# Altium footprint library con-samtec.PCBLIB: 805 footprints (part 50 of 55) (continued)
## TSW-144-02-S-T-RA [mil]
pads (132):
  oct 59.06x59.06 hole 39.37: 1(2150,60) 2(2150,160) 3(2150,260) 4(2050,60) 5(2050,160) 6(2050,260) 7(1950,60) 8(1950,160) 9(1950,260) 10(1850,60) 11(1850,160) 12(1850,260) 13(1750,60) 14(1750,160) 15(1750,260) 16(1650,60) 17(1650,160) 18(1650,260) 19(1550,60) 20(1550,160) 21(1550,260) 22(1450,60) 23(1450,160) 24(1450,260) 25(1350,60) 26(1350,160) 27(1350,260) 28(1250,60) 29(1250,160) 30(1250,260) 31(1150,60) 32(1150,160) 33(1150,260) 34(1050,60) 35(1050,160) 36(1050,260) 37(950,60) 38(950,160) 39(950,260) 40(850,60) 41(850,160) 42(850,260) 43(750,60) 44(750,160) 45(750,260) 46(650,60) 47(650,160) 48(650,260) 49(550,60) 50(550,160) 51(550,260) 52(450,60) 53(450,160) 54(450,260) 55(350,60) 56(350,160) 57(350,260) 58(250,60) 59(250,160) 60(250,260) 61(150,60) 62(150,160) 63(150,260) 64(50,60) 65(50,160) 66(50,260) 67(-50,60) 68(-50,160) 69(-50,260) 70(-150,60) 71(-150,160) 72(-150,260) 73(-250,60) 74(-250,160) 75(-250,260) 76(-350,60) 77(-350,160) 78(-350,260) 79(-450,60) 80(-450,160) 81(-450,260) 82(-550,60) 83(-550,160) 84(-550,260) 85(-650,60) 86(-650,160) 87(-650,260) 88(-750,60) 89(-750,160) 90(-750,260) 91(-850,60) 92(-850,160) 93(-850,260) 94(-950,60) 95(-950,160) 96(-950,260) 97(-1050,60) 98(-1050,160) 99(-1050,260) 100(-1150,60) 101(-1150,160) 102(-1150,260) 103(-1250,60) 104(-1250,160) 105(-1250,260) 106(-1350,60) 107(-1350,160) 108(-1350,260) 109(-1450,60) 110(-1450,160) 111(-1450,260) 112(-1550,60) 113(-1550,160) 114(-1550,260) 115(-1650,60) 116(-1650,160) 117(-1650,260) 118(-1750,60) 119(-1750,160) 120(-1750,260) 121(-1850,60) 122(-1850,160) 123(-1850,260) 124(-1950,60) 125(-1950,160) 126(-1950,260) 127(-2050,60) 128(-2050,160) 129(-2050,260) 130(-2150,60) 131(-2150,160) 132(-2150,260)
Top Overlay:
  rectangle: -2160,-310.63 -2140,-80.32
  rectangle: -2060,-310.63 -2040,-80.32
  rectangle: -1960,-310.63 -1940,-80.32
  rectangle: -1860,-310.63 -1840,-80.32
  rectangle: -1760,-310.63 -1740,-80.32
  rectangle: -1660,-310.63 -1640,-80.32
  rectangle: -1560,-310.63 -1540,-80.32
  rectangle: -1460,-310.63 -1440,-80.32
  rectangle: -1360,-310.63 -1340,-80.32
  rectangle: -1260,-310.63 -1240,-80.32
  rectangle: -1160,-310.63 -1140,-80.32
  rectangle: -1060,-310.63 -1040,-80.32
  rectangle: -960,-310.63 -940,-80.32
  rectangle: -860,-310.63 -840,-80.32
  rectangle: -760,-310.63 -740,-80.32
  rectangle: -660,-310.63 -640,-80.32
  rectangle: -560,-310.63 -540,-80.32
  rectangle: -460,-310.63 -440,-80.32
  rectangle: -360,-310.63 -340,-80.32
  rectangle: -260,-310.63 -240,-80.32
  rectangle: -160,-310.63 -140,-80.32
  rectangle: -60,-310.63 -40,-80.32
  rectangle: 40,-310.63 60,-80.32
  rectangle: 140,-310.63 160,-80.32
  rectangle: 240,-310.63 260,-80.32
  rectangle: 340,-310.63 360,-80.32
  rectangle: 440,-310.63 460,-80.32
  rectangle: 540,-310.63 560,-80.32
  rectangle: 640,-310.63 660,-80.32
  rectangle: 740,-310.63 760,-80.32
  rectangle: 840,-310.63 860,-80.32
  rectangle: 940,-310.63 960,-80.32
  rectangle: 1040,-310.63 1060,-80.32
  rectangle: 1140,-310.63 1160,-80.32
  rectangle: 1240,-310.63 1260,-80.32
  rectangle: 1340,-310.63 1360,-80.32
  rectangle: 1440,-310.63 1460,-80.32
  rectangle: 1540,-310.63 1560,-80.32
  rectangle: 1640,-310.63 1660,-80.32
  rectangle: 1740,-310.63 1760,-80.32
  rectangle: 1840,-310.63 1860,-80.32
  rectangle: 1940,-310.63 1960,-80.32
  rectangle: 2040,-310.63 2060,-80.32
  rectangle: 2140,-310.63 2160,-80.32
  lines w8: -2205.08,-80.55 2205.08,-80.55 2205.08,-4.17 -2205.08,-4.17 -2205.08,-80.55
  text "1" at 2201.57,41.34 h36.81
  text "3" at 2202.17,236.81 h36.81
Mechanical 16:
  rectangle: -2160,0 -2140,270
  rectangle: -2060,0 -2040,270
  rectangle: -1960,0 -1940,270
  rectangle: -1860,0 -1840,270
  rectangle: -1760,0 -1740,270
  rectangle: -1660,0 -1640,270
  rectangle: -1560,0 -1540,270
  rectangle: -1460,0 -1440,270
  rectangle: -1360,0 -1340,270
  rectangle: -1260,0 -1240,270
  rectangle: -1160,0 -1140,270
  rectangle: -1060,0 -1040,270
  rectangle: -960,0 -940,270
  rectangle: -860,0 -840,270
  rectangle: -760,0 -740,270
  rectangle: -660,0 -640,270
  rectangle: -560,0 -540,270
  rectangle: -460,0 -440,270
  rectangle: -360,0 -340,270
  rectangle: -260,0 -240,270
  rectangle: -160,0 -140,270
  rectangle: -60,0 -40,270
  rectangle: 40,0 60,270
  rectangle: 140,0 160,270
  rectangle: 240,0 260,270
  rectangle: 340,0 360,270
  rectangle: 440,0 460,270
  rectangle: 540,0 560,270
  rectangle: 640,0 660,270
  rectangle: 740,0 760,270
  rectangle: 840,0 860,270
  rectangle: 940,0 960,270
  rectangle: 1040,0 1060,270
  rectangle: 1140,0 1160,270
  rectangle: 1240,0 1260,270
  rectangle: 1340,0 1360,270
  rectangle: 1440,0 1460,270
  rectangle: 1540,0 1560,270
  rectangle: 1640,0 1660,270
  rectangle: 1740,0 1760,270
  rectangle: 1840,0 1860,270
  rectangle: 1940,0 1960,270
  rectangle: 2040,0 2060,270
  rectangle: 2140,0 2160,270

## TSW-145-02-S-D [mm]
pads (90):
  oct 1.5x1.5 hole 1: 1(55.88,-1.27) 2(55.88,1.27) 3(53.34,-1.27) 4(53.34,1.27) 5(50.8,-1.27) 6(50.8,1.27) 7(48.26,-1.27) 8(48.26,1.27) 9(45.72,-1.27) 10(45.72,1.27) 11(43.18,-1.27) 12(43.18,1.27) 13(40.64,-1.27) 14(40.64,1.27) 15(38.1,-1.27) 16(38.1,1.27) 17(35.56,-1.27) 18(35.56,1.27) 19(33.02,-1.27) 20(33.02,1.27) 21(30.48,-1.27) 22(30.48,1.27) 23(27.94,-1.27) 24(27.94,1.27) 25(25.4,-1.27) 26(25.4,1.27) 27(22.86,-1.27) 28(22.86,1.27) 29(20.32,-1.27) 30(20.32,1.27) 31(17.78,-1.27) 32(17.78,1.27) 33(15.24,-1.27) 34(15.24,1.27) 35(12.7,-1.27) 36(12.7,1.27) 37(10.16,-1.27) 38(10.16,1.27) 39(7.62,-1.27) 40(7.62,1.27) 41(5.08,-1.27) 42(5.08,1.27) 43(2.54,-1.27) 44(2.54,1.27) 45(0,-1.27) 46(0,1.27) 47(-2.54,-1.27) 48(-2.54,1.27) 49(-5.08,-1.27) 50(-5.08,1.27) 51(-7.62,-1.27) 52(-7.62,1.27) 53(-10.16,-1.27) 54(-10.16,1.27) 55(-12.7,-1.27) 56(-12.7,1.27) 57(-15.24,-1.27) 58(-15.24,1.27) 59(-17.78,-1.27) 60(-17.78,1.27) 61(-20.32,-1.27) 62(-20.32,1.27) 63(-22.86,-1.27) 64(-22.86,1.27) 65(-25.4,-1.27) 66(-25.4,1.27) 67(-27.94,-1.27) 68(-27.94,1.27) 69(-30.48,-1.27) 70(-30.48,1.27) 71(-33.02,-1.27) 72(-33.02,1.27) 73(-35.56,-1.27) 74(-35.56,1.27) 75(-38.1,-1.27) 76(-38.1,1.27) 77(-40.64,-1.27) 78(-40.64,1.27) 79(-43.18,-1.27) 80(-43.18,1.27) 81(-45.72,-1.27) 82(-45.72,1.27) 83(-48.26,-1.27) 84(-48.26,1.27) 85(-50.8,-1.27) 86(-50.8,1.27) 87(-53.34,-1.27) 88(-53.34,1.27) 89(-55.88,-1.27) 90(-55.88,1.27)
Top Overlay:
  lines w0.203: -57.279,-2.425 57.279,-2.425 57.279,2.425 -57.279,2.425 -57.279,-2.425
  text "1" at 55.672,-3.818 h0.94
  text "2" at 55.497,2.744 h0.94
Mechanical 16:
  rectangle: -56.23,-1.62 -55.53,-0.92
  rectangle: -56.23,0.92 -55.53,1.62
  rectangle: -53.69,-1.62 -52.99,-0.92
  rectangle: -53.69,0.92 -52.99,1.62
  rectangle: -51.15,-1.62 -50.45,-0.92
  rectangle: -51.15,0.92 -50.45,1.62
  rectangle: -48.61,-1.62 -47.91,-0.92
  rectangle: -48.61,0.92 -47.91,1.62
  rectangle: -46.07,-1.62 -45.37,-0.92
  rectangle: -46.07,0.92 -45.37,1.62
  rectangle: -43.53,-1.62 -42.83,-0.92
  rectangle: -43.53,0.92 -42.83,1.62
  rectangle: -40.99,-1.62 -40.29,-0.92
  rectangle: -40.99,0.92 -40.29,1.62
  rectangle: -38.45,-1.62 -37.75,-0.92
  rectangle: -38.45,0.92 -37.75,1.62
  rectangle: -35.91,-1.62 -35.21,-0.92
  rectangle: -35.91,0.92 -35.21,1.62
  rectangle: -33.37,-1.62 -32.67,-0.92
  rectangle: -33.37,0.92 -32.67,1.62
  rectangle: -30.83,-1.62 -30.13,-0.92
  rectangle: -30.83,0.92 -30.13,1.62
  rectangle: -28.29,-1.62 -27.59,-0.92
  rectangle: -28.29,0.92 -27.59,1.62
  rectangle: -25.75,-1.62 -25.05,-0.92
  rectangle: -25.75,0.92 -25.05,1.62
  rectangle: -23.21,-1.62 -22.51,-0.92
  rectangle: -23.21,0.92 -22.51,1.62
  rectangle: -20.67,-1.62 -19.97,-0.92
  rectangle: -20.67,0.92 -19.97,1.62
  rectangle: -18.13,-1.62 -17.43,-0.92
  rectangle: -18.13,0.92 -17.43,1.62
  rectangle: -15.59,-1.62 -14.89,-0.92
  rectangle: -15.59,0.92 -14.89,1.62
  rectangle: -13.05,-1.62 -12.35,-0.92
  rectangle: -13.05,0.92 -12.35,1.62
  rectangle: -10.51,-1.62 -9.81,-0.92
  rectangle: -10.51,0.92 -9.81,1.62
  rectangle: -7.97,-1.62 -7.27,-0.92
  rectangle: -7.97,0.92 -7.27,1.62
  rectangle: -5.43,-1.62 -4.73,-0.92
  rectangle: -5.43,0.92 -4.73,1.62
  rectangle: -2.89,-1.62 -2.19,-0.92
  rectangle: -2.89,0.92 -2.19,1.62
  rectangle: -0.35,-1.62 0.35,-0.92
  rectangle: -0.35,0.92 0.35,1.62
  rectangle: 2.19,-1.62 2.89,-0.92
  rectangle: 2.19,0.92 2.89,1.62
  rectangle: 4.73,-1.62 5.43,-0.92
  rectangle: 4.73,0.92 5.43,1.62
  rectangle: 7.27,-1.62 7.97,-0.92
  rectangle: 7.27,0.92 7.97,1.62
  rectangle: 9.81,-1.62 10.51,-0.92
  rectangle: 9.81,0.92 10.51,1.62
  rectangle: 12.35,-1.62 13.05,-0.92
  rectangle: 12.35,0.92 13.05,1.62
  rectangle: 14.89,-1.62 15.59,-0.92
  rectangle: 14.89,0.92 15.59,1.62
  rectangle: 17.43,-1.62 18.13,-0.92
  rectangle: 17.43,0.92 18.13,1.62
  rectangle: 19.97,-1.62 20.67,-0.92
  rectangle: 19.97,0.92 20.67,1.62
  rectangle: 22.51,-1.62 23.21,-0.92
  rectangle: 22.51,0.92 23.21,1.62
  rectangle: 25.05,-1.62 25.75,-0.92
  rectangle: 25.05,0.92 25.75,1.62
  rectangle: 27.59,-1.62 28.29,-0.92
  rectangle: 27.59,0.92 28.29,1.62
  rectangle: 30.13,-1.62 30.83,-0.92
  rectangle: 30.13,0.92 30.83,1.62
  rectangle: 32.67,-1.62 33.37,-0.92
  rectangle: 32.67,0.92 33.37,1.62
  rectangle: 35.21,-1.62 35.91,-0.92
  rectangle: 35.21,0.92 35.91,1.62
  rectangle: 37.75,-1.62 38.45,-0.92
  rectangle: 37.75,0.92 38.45,1.62
  rectangle: 40.29,-1.62 40.99,-0.92
  rectangle: 40.29,0.92 40.99,1.62
  rectangle: 42.83,-1.62 43.53,-0.92
  rectangle: 42.83,0.92 43.53,1.62
  rectangle: 45.37,-1.62 46.07,-0.92
  rectangle: 45.37,0.92 46.07,1.62
  rectangle: 47.91,-1.62 48.61,-0.92
  rectangle: 47.91,0.92 48.61,1.62
  rectangle: 50.45,-1.62 51.15,-0.92
  rectangle: 50.45,0.92 51.15,1.62
  rectangle: 52.99,-1.62 53.69,-0.92
  rectangle: 52.99,0.92 53.69,1.62
  rectangle: 55.53,-1.62 56.23,-0.92
  rectangle: 55.53,0.92 56.23,1.62

## TSW-145-02-S-D-RA [mil]
pads (90):
  oct 59.06x59.06 hole 39.37: 1(2200,60) 2(2200,160) 3(2100,60) 4(2100,160) 5(2000,60) 6(2000,160) 7(1900,60) 8(1900,160) 9(1800,60) 10(1800,160) 11(1700,60) 12(1700,160) 13(1600,60) 14(1600,160) 15(1500,60) 16(1500,160) 17(1400,60) 18(1400,160) 19(1300,60) 20(1300,160) 21(1200,60) 22(1200,160) 23(1100,60) 24(1100,160) 25(1000,60) 26(1000,160) 27(900,60) 28(900,160) 29(800,60) 30(800,160) 31(700,60) 32(700,160) 33(600,60) 34(600,160) 35(500,60) 36(500,160) 37(400,60) 38(400,160) 39(300,60) 40(300,160) 41(200,60) 42(200,160) 43(100,60) 44(100,160) 45(0,60) 46(0,160) 47(-100,60) 48(-100,160) 49(-200,60) 50(-200,160) 51(-300,60) 52(-300,160) 53(-400,60) 54(-400,160) 55(-500,60) 56(-500,160) 57(-600,60) 58(-600,160) 59(-700,60) 60(-700,160) 61(-800,60) 62(-800,160) 63(-900,60) 64(-900,160) 65(-1000,60) 66(-1000,160) 67(-1100,60) 68(-1100,160) 69(-1200,60) 70(-1200,160) 71(-1300,60) 72(-1300,160) 73(-1400,60) 74(-1400,160) 75(-1500,60) 76(-1500,160) 77(-1600,60) 78(-1600,160) 79(-1700,60) 80(-1700,160) 81(-1800,60) 82(-1800,160) 83(-1900,60) 84(-1900,160) 85(-2000,60) 86(-2000,160) 87(-2100,60) 88(-2100,160) 89(-2200,60) 90(-2200,160)
Top Overlay:
  rectangle: -2210,-310.63 -2190,-80.32
  rectangle: -2110,-310.63 -2090,-80.32
  rectangle: -2010,-310.63 -1990,-80.32
  rectangle: -1910,-310.63 -1890,-80.32
  rectangle: -1810,-310.63 -1790,-80.32
  rectangle: -1710,-310.63 -1690,-80.32
  rectangle: -1610,-310.63 -1590,-80.32
  rectangle: -1510,-310.63 -1490,-80.32
  rectangle: -1410,-310.63 -1390,-80.32
  rectangle: -1310,-310.63 -1290,-80.32
  rectangle: -1210,-310.63 -1190,-80.32
  rectangle: -1110,-310.63 -1090,-80.32
  rectangle: -1010,-310.63 -990,-80.32
  rectangle: -910,-310.63 -890,-80.32
  rectangle: -810,-310.63 -790,-80.32
  rectangle: -710,-310.63 -690,-80.32
  rectangle: -610,-310.63 -590,-80.32
  rectangle: -510,-310.63 -490,-80.32
  rectangle: -410,-310.63 -390,-80.32
  rectangle: -310,-310.63 -290,-80.32
  rectangle: -210,-310.63 -190,-80.32
  rectangle: -110,-310.63 -90,-80.32
  rectangle: -10,-310.63 10,-80.32
  rectangle: 90,-310.63 110,-80.32
  rectangle: 190,-310.63 210,-80.32
  rectangle: 290,-310.63 310,-80.32
  rectangle: 390,-310.63 410,-80.32
  rectangle: 490,-310.63 510,-80.32
  rectangle: 590,-310.63 610,-80.32
  rectangle: 690,-310.63 710,-80.32
  rectangle: 790,-310.63 810,-80.32
  rectangle: 890,-310.63 910,-80.32
  rectangle: 990,-310.63 1010,-80.32
  rectangle: 1090,-310.63 1110,-80.32
  rectangle: 1190,-310.63 1210,-80.32
  rectangle: 1290,-310.63 1310,-80.32
  rectangle: 1390,-310.63 1410,-80.32
  rectangle: 1490,-310.63 1510,-80.32
  rectangle: 1590,-310.63 1610,-80.32
  rectangle: 1690,-310.63 1710,-80.32
  rectangle: 1790,-310.63 1810,-80.32
  rectangle: 1890,-310.63 1910,-80.32
  rectangle: 1990,-310.63 2010,-80.32
  rectangle: 2090,-310.63 2110,-80.32
  rectangle: 2190,-310.63 2210,-80.32
  lines w8: -2255.08,-80.55 2255.08,-80.55 2255.08,-4.17 -2255.08,-4.17 -2255.08,-80.55
  text "1" at 2250.59,30.51 h36.81
  text "2" at 2249.21,129.53 h36.81
Mechanical 16:
  rectangle: -2210,0 -2190,170
  rectangle: -2110,0 -2090,170
  rectangle: -2010,0 -1990,170
  rectangle: -1910,0 -1890,170
  rectangle: -1810,0 -1790,170
  rectangle: -1710,0 -1690,170
  rectangle: -1610,0 -1590,170
  rectangle: -1510,0 -1490,170
  rectangle: -1410,0 -1390,170
  rectangle: -1310,0 -1290,170
  rectangle: -1210,0 -1190,170
  rectangle: -1110,0 -1090,170
  rectangle: -1010,0 -990,170
  rectangle: -910,0 -890,170
  rectangle: -810,0 -790,170
  rectangle: -710,0 -690,170
  rectangle: -610,0 -590,170
  rectangle: -510,0 -490,170
  rectangle: -410,0 -390,170
  rectangle: -310,0 -290,170
  rectangle: -210,0 -190,170
  rectangle: -110,0 -90,170
  rectangle: -10,0 10,170
  rectangle: 90,0 110,170
  rectangle: 190,0 210,170
  rectangle: 290,0 310,170
  rectangle: 390,0 410,170
  rectangle: 490,0 510,170
  rectangle: 590,0 610,170
  rectangle: 690,0 710,170
  rectangle: 790,0 810,170
  rectangle: 890,0 910,170
  rectangle: 990,0 1010,170
  rectangle: 1090,0 1110,170
  rectangle: 1190,0 1210,170
  rectangle: 1290,0 1310,170
  rectangle: 1390,0 1410,170
  rectangle: 1490,0 1510,170
  rectangle: 1590,0 1610,170
  rectangle: 1690,0 1710,170
  rectangle: 1790,0 1810,170
  rectangle: 1890,0 1910,170
  rectangle: 1990,0 2010,170
  rectangle: 2090,0 2110,170
  rectangle: 2190,0 2210,170

## TSW-145-02-S-Q [mm]
pads (90):
  oct 1.5x1.5 hole 1: 1(55.88,-2.54) 2(55.88,2.54) 3(53.34,-2.54) 4(53.34,2.54) 5(50.8,-2.54) 6(50.8,2.54) 7(48.26,-2.54) 8(48.26,2.54) 9(45.72,-2.54) 10(45.72,2.54) 11(43.18,-2.54) 12(43.18,2.54) 13(40.64,-2.54) 14(40.64,2.54) 15(38.1,-2.54) 16(38.1,2.54) 17(35.56,-2.54) 18(35.56,2.54) 19(33.02,-2.54) 20(33.02,2.54) 21(30.48,-2.54) 22(30.48,2.54) 23(27.94,-2.54) 24(27.94,2.54) 25(25.4,-2.54) 26(25.4,2.54) 27(22.86,-2.54) 28(22.86,2.54) 29(20.32,-2.54) 30(20.32,2.54) 31(17.78,-2.54) 32(17.78,2.54) 33(15.24,-2.54) 34(15.24,2.54) 35(12.7,-2.54) 36(12.7,2.54) 37(10.16,-2.54) 38(10.16,2.54) 39(7.62,-2.54) 40(7.62,2.54) 41(5.08,-2.54) 42(5.08,2.54) 43(2.54,-2.54) 44(2.54,2.54) 45(0,-2.54) 46(0,2.54) 47(-2.54,-2.54) 48(-2.54,2.54) 49(-5.08,-2.54) 50(-5.08,2.54) 51(-7.62,-2.54) 52(-7.62,2.54) 53(-10.16,-2.54) 54(-10.16,2.54) 55(-12.7,-2.54) 56(-12.7,2.54) 57(-15.24,-2.54) 58(-15.24,2.54) 59(-17.78,-2.54) 60(-17.78,2.54) 61(-20.32,-2.54) 62(-20.32,2.54) 63(-22.86,-2.54) 64(-22.86,2.54) 65(-25.4,-2.54) 66(-25.4,2.54) 67(-27.94,-2.54) 68(-27.94,2.54) 69(-30.48,-2.54) 70(-30.48,2.54) 71(-33.02,-2.54) 72(-33.02,2.54) 73(-35.56,-2.54) 74(-35.56,2.54) 75(-38.1,-2.54) 76(-38.1,2.54) 77(-40.64,-2.54) 78(-40.64,2.54) 79(-43.18,-2.54) 80(-43.18,2.54) 81(-45.72,-2.54) 82(-45.72,2.54) 83(-48.26,-2.54) 84(-48.26,2.54) 85(-50.8,-2.54) 86(-50.8,2.54) 87(-53.34,-2.54) 88(-53.34,2.54) 89(-55.88,-2.54) 90(-55.88,2.54)
Top Overlay:
  lines w0.203: -57.279,-3.695 57.279,-3.695 57.279,3.695 -57.279,3.695 -57.279,-3.695
  text "1" at 55.722,-5.138 h0.94
  text "2" at 55.622,3.989 h0.94
Mechanical 16:
  rectangle: -56.23,-2.89 -55.53,-2.19
  rectangle: -56.23,2.19 -55.53,2.89
  rectangle: -53.69,-2.89 -52.99,-2.19
  rectangle: -53.69,2.19 -52.99,2.89
  rectangle: -51.15,-2.89 -50.45,-2.19
  rectangle: -51.15,2.19 -50.45,2.89
  rectangle: -48.61,-2.89 -47.91,-2.19
  rectangle: -48.61,2.19 -47.91,2.89
  rectangle: -46.07,-2.89 -45.37,-2.19
  rectangle: -46.07,2.19 -45.37,2.89
  rectangle: -43.53,-2.89 -42.83,-2.19
  rectangle: -43.53,2.19 -42.83,2.89
  rectangle: -40.99,-2.89 -40.29,-2.19
  rectangle: -40.99,2.19 -40.29,2.89
  rectangle: -38.45,-2.89 -37.75,-2.19
  rectangle: -38.45,2.19 -37.75,2.89
  rectangle: -35.91,-2.89 -35.21,-2.19
  rectangle: -35.91,2.19 -35.21,2.89
  rectangle: -33.37,-2.89 -32.67,-2.19
  rectangle: -33.37,2.19 -32.67,2.89
  rectangle: -30.83,-2.89 -30.13,-2.19
  rectangle: -30.83,2.19 -30.13,2.89
  rectangle: -28.29,-2.89 -27.59,-2.19
  rectangle: -28.29,2.19 -27.59,2.89
  rectangle: -25.75,-2.89 -25.05,-2.19
  rectangle: -25.75,2.19 -25.05,2.89
  rectangle: -23.21,-2.89 -22.51,-2.19
  rectangle: -23.21,2.19 -22.51,2.89
  rectangle: -20.67,-2.89 -19.97,-2.19
  rectangle: -20.67,2.19 -19.97,2.89
  rectangle: -18.13,-2.89 -17.43,-2.19
  rectangle: -18.13,2.19 -17.43,2.89
  rectangle: -15.59,-2.89 -14.89,-2.19
  rectangle: -15.59,2.19 -14.89,2.89
  rectangle: -13.05,-2.89 -12.35,-2.19
  rectangle: -13.05,2.19 -12.35,2.89
  rectangle: -10.51,-2.89 -9.81,-2.19
  rectangle: -10.51,2.19 -9.81,2.89
  rectangle: -7.97,-2.89 -7.27,-2.19
  rectangle: -7.97,2.19 -7.27,2.89
  rectangle: -5.43,-2.89 -4.73,-2.19
  rectangle: -5.43,2.19 -4.73,2.89
  rectangle: -2.89,-2.89 -2.19,-2.19
  rectangle: -2.89,2.19 -2.19,2.89
  rectangle: -0.35,-2.89 0.35,-2.19
  rectangle: -0.35,2.19 0.35,2.89
  rectangle: 2.19,-2.89 2.89,-2.19
  rectangle: 2.19,2.19 2.89,2.89
  rectangle: 4.73,-2.89 5.43,-2.19
  rectangle: 4.73,2.19 5.43,2.89
  rectangle: 7.27,-2.89 7.97,-2.19
  rectangle: 7.27,2.19 7.97,2.89
  rectangle: 9.81,-2.89 10.51,-2.19
  rectangle: 9.81,2.19 10.51,2.89
  rectangle: 12.35,-2.89 13.05,-2.19
  rectangle: 12.35,2.19 13.05,2.89
  rectangle: 14.89,-2.89 15.59,-2.19
  rectangle: 14.89,2.19 15.59,2.89
  rectangle: 17.43,-2.89 18.13,-2.19
  rectangle: 17.43,2.19 18.13,2.89
  rectangle: 19.97,-2.89 20.67,-2.19
  rectangle: 19.97,2.19 20.67,2.89
  rectangle: 22.51,-2.89 23.21,-2.19
  rectangle: 22.51,2.19 23.21,2.89
  rectangle: 25.05,-2.89 25.75,-2.19
  rectangle: 25.05,2.19 25.75,2.89
  rectangle: 27.59,-2.89 28.29,-2.19
  rectangle: 27.59,2.19 28.29,2.89
  rectangle: 30.13,-2.89 30.83,-2.19
  rectangle: 30.13,2.19 30.83,2.89
  rectangle: 32.67,-2.89 33.37,-2.19
  rectangle: 32.67,2.19 33.37,2.89
  rectangle: 35.21,-2.89 35.91,-2.19
  rectangle: 35.21,2.19 35.91,2.89
  rectangle: 37.75,-2.89 38.45,-2.19
  rectangle: 37.75,2.19 38.45,2.89
  rectangle: 40.29,-2.89 40.99,-2.19
  rectangle: 40.29,2.19 40.99,2.89
  rectangle: 42.83,-2.89 43.53,-2.19
  rectangle: 42.83,2.19 43.53,2.89
  rectangle: 45.37,-2.89 46.07,-2.19
  rectangle: 45.37,2.19 46.07,2.89
  rectangle: 47.91,-2.89 48.61,-2.19
  rectangle: 47.91,2.19 48.61,2.89
  rectangle: 50.45,-2.89 51.15,-2.19
  rectangle: 50.45,2.19 51.15,2.89
  rectangle: 52.99,-2.89 53.69,-2.19
  rectangle: 52.99,2.19 53.69,2.89
  rectangle: 55.53,-2.89 56.23,-2.19
  rectangle: 55.53,2.19 56.23,2.89

## TSW-145-02-S-Q-RA [mil]
pads (90):
  oct 59.06x59.06 hole 39.37: 1(2200,60) 2(2200,260) 3(2100,60) 4(2100,260) 5(2000,60) 6(2000,260) 7(1900,60) 8(1900,260) 9(1800,60) 10(1800,260) 11(1700,60) 12(1700,260) 13(1600,60) 14(1600,260) 15(1500,60) 16(1500,260) 17(1400,60) 18(1400,260) 19(1300,60) 20(1300,260) 21(1200,60) 22(1200,260) 23(1100,60) 24(1100,260) 25(1000,60) 26(1000,260) 27(900,60) 28(900,260) 29(800,60) 30(800,260) 31(700,60) 32(700,260) 33(600,60) 34(600,260) 35(500,60) 36(500,260) 37(400,60) 38(400,260) 39(300,60) 40(300,260) 41(200,60) 42(200,260) 43(100,60) 44(100,260) 45(0,60) 46(0,260) 47(-100,60) 48(-100,260) 49(-200,60) 50(-200,260) 51(-300,60) 52(-300,260) 53(-400,60) 54(-400,260) 55(-500,60) 56(-500,260) 57(-600,60) 58(-600,260) 59(-700,60) 60(-700,260) 61(-800,60) 62(-800,260) 63(-900,60) 64(-900,260) 65(-1000,60) 66(-1000,260) 67(-1100,60) 68(-1100,260) 69(-1200,60) 70(-1200,260) 71(-1300,60) 72(-1300,260) 73(-1400,60) 74(-1400,260) 75(-1500,60) 76(-1500,260) 77(-1600,60) 78(-1600,260) 79(-1700,60) 80(-1700,260) 81(-1800,60) 82(-1800,260) 83(-1900,60) 84(-1900,260) 85(-2000,60) 86(-2000,260) 87(-2100,60) 88(-2100,260) 89(-2200,60) 90(-2200,260)
Top Overlay:
  rectangle: -2210,-310.63 -2190,-80.32
  rectangle: -2110,-310.63 -2090,-80.32
  rectangle: -2010,-310.63 -1990,-80.32
  rectangle: -1910,-310.63 -1890,-80.32
  rectangle: -1810,-310.63 -1790,-80.32
  rectangle: -1710,-310.63 -1690,-80.32
  rectangle: -1610,-310.63 -1590,-80.32
  rectangle: -1510,-310.63 -1490,-80.32
  rectangle: -1410,-310.63 -1390,-80.32
  rectangle: -1310,-310.63 -1290,-80.32
  rectangle: -1210,-310.63 -1190,-80.32
  rectangle: -1110,-310.63 -1090,-80.32
  rectangle: -1010,-310.63 -990,-80.32
  rectangle: -910,-310.63 -890,-80.32
  rectangle: -810,-310.63 -790,-80.32
  rectangle: -710,-310.63 -690,-80.32
  rectangle: -610,-310.63 -590,-80.32
  rectangle: -510,-310.63 -490,-80.32
  rectangle: -410,-310.63 -390,-80.32
  rectangle: -310,-310.63 -290,-80.32
  rectangle: -210,-310.63 -190,-80.32
  rectangle: -110,-310.63 -90,-80.32
  rectangle: -10,-310.63 10,-80.32
  rectangle: 90,-310.63 110,-80.32
  rectangle: 190,-310.63 210,-80.32
  rectangle: 290,-310.63 310,-80.32
  rectangle: 390,-310.63 410,-80.32
  rectangle: 490,-310.63 510,-80.32
  rectangle: 590,-310.63 610,-80.32
  rectangle: 690,-310.63 710,-80.32
  rectangle: 790,-310.63 810,-80.32
  rectangle: 890,-310.63 910,-80.32
  rectangle: 990,-310.63 1010,-80.32
  rectangle: 1090,-310.63 1110,-80.32
  rectangle: 1190,-310.63 1210,-80.32
  rectangle: 1290,-310.63 1310,-80.32
  rectangle: 1390,-310.63 1410,-80.32
  rectangle: 1490,-310.63 1510,-80.32
  rectangle: 1590,-310.63 1610,-80.32
  rectangle: 1690,-310.63 1710,-80.32
  rectangle: 1790,-310.63 1810,-80.32
  rectangle: 1890,-310.63 1910,-80.32
  rectangle: 1990,-310.63 2010,-80.32
  rectangle: 2090,-310.63 2110,-80.32
  rectangle: 2190,-310.63 2210,-80.32
  lines w8: -2255.08,-80.55 2255.08,-80.55 2255.08,-4.17 -2255.08,-4.17 -2255.08,-80.55
  text "1" at 2253.54,43.31 h36.81
  text "2" at 2251.18,242.72 h36.81
Mechanical 16:
  rectangle: -2210,0 -2190,270
  rectangle: -2110,0 -2090,270
  rectangle: -2010,0 -1990,270
  rectangle: -1910,0 -1890,270
  rectangle: -1810,0 -1790,270
  rectangle: -1710,0 -1690,270
  rectangle: -1610,0 -1590,270
  rectangle: -1510,0 -1490,270
  rectangle: -1410,0 -1390,270
  rectangle: -1310,0 -1290,270
  rectangle: -1210,0 -1190,270
  rectangle: -1110,0 -1090,270
  rectangle: -1010,0 -990,270
  rectangle: -910,0 -890,270
  rectangle: -810,0 -790,270
  rectangle: -710,0 -690,270
  rectangle: -610,0 -590,270
  rectangle: -510,0 -490,270
  rectangle: -410,0 -390,270
  rectangle: -310,0 -290,270
  rectangle: -210,0 -190,270
  rectangle: -110,0 -90,270
  rectangle: -10,0 10,270
  rectangle: 90,0 110,270
  rectangle: 190,0 210,270
  rectangle: 290,0 310,270
  rectangle: 390,0 410,270
  rectangle: 490,0 510,270
  rectangle: 590,0 610,270
  rectangle: 690,0 710,270
  rectangle: 790,0 810,270
  rectangle: 890,0 910,270
  rectangle: 990,0 1010,270
  rectangle: 1090,0 1110,270
  rectangle: 1190,0 1210,270
  rectangle: 1290,0 1310,270
  rectangle: 1390,0 1410,270
  rectangle: 1490,0 1510,270
  rectangle: 1590,0 1610,270
  rectangle: 1690,0 1710,270
  rectangle: 1790,0 1810,270
  rectangle: 1890,0 1910,270
  rectangle: 1990,0 2010,270
  rectangle: 2090,0 2110,270
  rectangle: 2190,0 2210,270

## TSW-145-02-S-S [mm]
pads (45):
  oct 1.5x1.5 hole 1: 1(55.88,0) 2(53.34,0) 3(50.8,0) 4(48.26,0) 5(45.72,0) 6(43.18,0) 7(40.64,0) 8(38.1,0) 9(35.56,0) 10(33.02,0) 11(30.48,0) 12(27.94,0) 13(25.4,0) 14(22.86,0) 15(20.32,0) 16(17.78,0) 17(15.24,0) 18(12.7,0) 19(10.16,0) 20(7.62,0) 21(5.08,0) 22(2.54,0) 23(0,0) 24(-2.54,0) 25(-5.08,0) 26(-7.62,0) 27(-10.16,0) 28(-12.7,0) 29(-15.24,0) 30(-17.78,0) 31(-20.32,0) 32(-22.86,0) 33(-25.4,0) 34(-27.94,0) 35(-30.48,0) 36(-33.02,0) 37(-35.56,0) 38(-38.1,0) 39(-40.64,0) 40(-43.18,0) 41(-45.72,0) 42(-48.26,0) 43(-50.8,0) 44(-53.34,0) 45(-55.88,0)
Top Overlay:
  lines w0.203: -57.279,-1.155 57.279,-1.155 57.279,1.155 -57.279,1.155 -57.279,-1.155
  text "1" at 55.622,-2.498 h0.94
Mechanical 16:
  rectangle: -56.23,-0.35 -55.53,0.35
  rectangle: -53.69,-0.35 -52.99,0.35
  rectangle: -51.15,-0.35 -50.45,0.35
  rectangle: -48.61,-0.35 -47.91,0.35
  rectangle: -46.07,-0.35 -45.37,0.35
  rectangle: -43.53,-0.35 -42.83,0.35
  rectangle: -40.99,-0.35 -40.29,0.35
  rectangle: -38.45,-0.35 -37.75,0.35
  rectangle: -35.91,-0.35 -35.21,0.35
  rectangle: -33.37,-0.35 -32.67,0.35
  rectangle: -30.83,-0.35 -30.13,0.35
  rectangle: -28.29,-0.35 -27.59,0.35
  rectangle: -25.75,-0.35 -25.05,0.35
  rectangle: -23.21,-0.35 -22.51,0.35
  rectangle: -20.67,-0.35 -19.97,0.35
  rectangle: -18.13,-0.35 -17.43,0.35
  rectangle: -15.59,-0.35 -14.89,0.35
  rectangle: -13.05,-0.35 -12.35,0.35
  rectangle: -10.51,-0.35 -9.81,0.35
  rectangle: -7.97,-0.35 -7.27,0.35
  rectangle: -5.43,-0.35 -4.73,0.35
  rectangle: -2.89,-0.35 -2.19,0.35
  rectangle: -0.35,-0.35 0.35,0.35
  rectangle: 2.19,-0.35 2.89,0.35
  rectangle: 4.73,-0.35 5.43,0.35
  rectangle: 7.27,-0.35 7.97,0.35
  rectangle: 9.81,-0.35 10.51,0.35
  rectangle: 12.35,-0.35 13.05,0.35
  rectangle: 14.89,-0.35 15.59,0.35
  rectangle: 17.43,-0.35 18.13,0.35
  rectangle: 19.97,-0.35 20.67,0.35
  rectangle: 22.51,-0.35 23.21,0.35
  rectangle: 25.05,-0.35 25.75,0.35
  rectangle: 27.59,-0.35 28.29,0.35
  rectangle: 30.13,-0.35 30.83,0.35
  rectangle: 32.67,-0.35 33.37,0.35
  rectangle: 35.21,-0.35 35.91,0.35
  rectangle: 37.75,-0.35 38.45,0.35
  rectangle: 40.29,-0.35 40.99,0.35
  rectangle: 42.83,-0.35 43.53,0.35
  rectangle: 45.37,-0.35 46.07,0.35
  rectangle: 47.91,-0.35 48.61,0.35
  rectangle: 50.45,-0.35 51.15,0.35
  rectangle: 52.99,-0.35 53.69,0.35
  rectangle: 55.53,-0.35 56.23,0.35